# Altium footprint library FOTA.PcbLib: 41 footprints (part 2 of 3)
Each footprint in its own frame and in the unit in brackets; x right, y up, seen from the top. Pads: shape width x height; smd on the part's side, far side on the other; paste and mask are expansions set on the pad; w line width, h text height; cw(c..) or ccw(c..) is an arc to the next point about the centre after c.
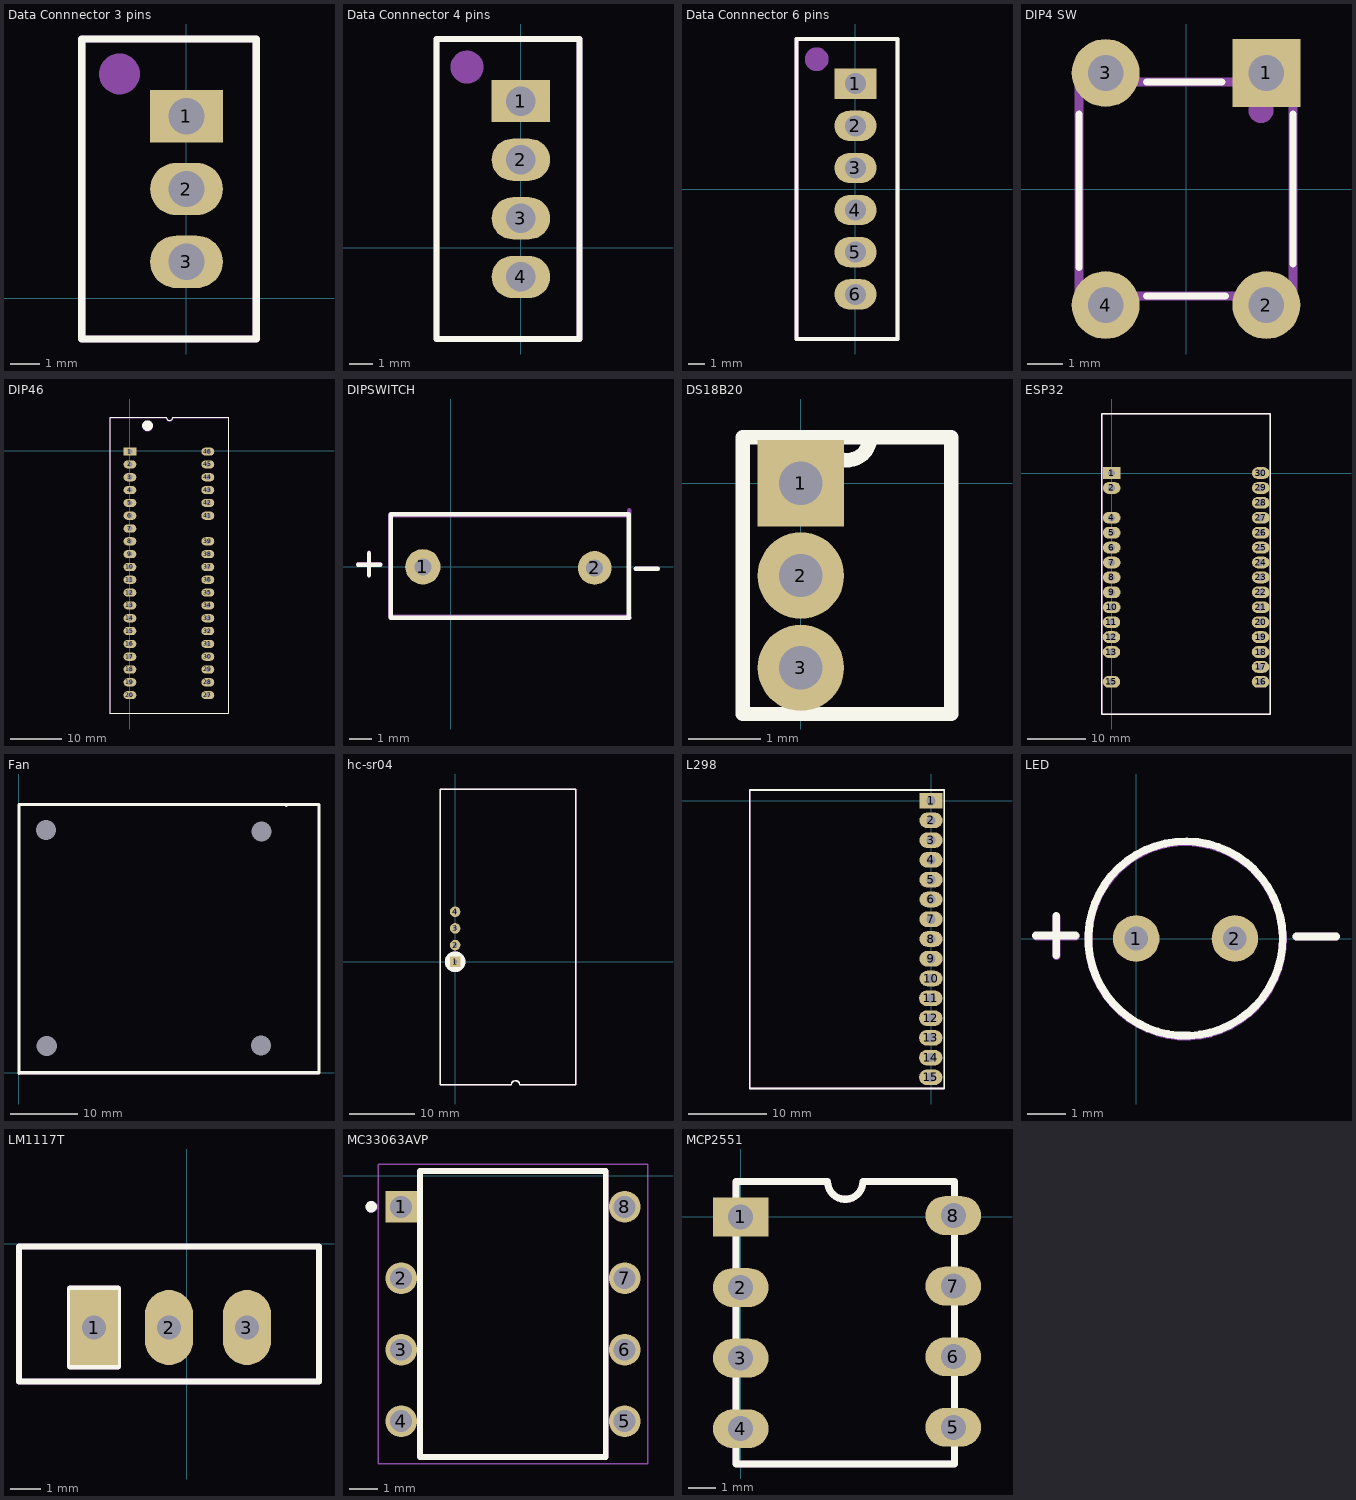
[diagram p1: the footprints below, top view; thin cyan lines are the x and y axes]

## Data Connnector 3 pins [mm]
pads (3):
  rect 2.5x1.8 hole 1.25: 1(0,6.25)
  oval 2.5x1.8 hole 1.25: 2(0,3.75) 3(0,1.25)
Top Overlay:
  lines w0.254: -3.6,-1.4 2.4,-1.4 2.4,8.9 -3.6,8.9 -3.6,-1.4
Mechanical 2:
  circle w1: c-2.3,7.7 r0.2
  lines w0.254: -3.6,-1.4 -3.6,8.9 2.4,8.9 2.4,-1.4 -3.6,-1.4
  text ".Designator" at -1.4,5.2 h2
3D body "User Library-jst-b3b-xh-a.step": height 6.91, standoff -3.49, extent -3.475,-1.2 2.275,8.7

## Data Connnector 4 pins [mm]
pads (4):
  rect 2.5x1.8 hole 1.25: 1(0,6.25)
  oval 2.5x1.8 hole 1.25: 2(0,3.75) 3(0,1.25) 4(0,-1.25)
Top Overlay:
  lines w0.254: -3.6,-3.9 -3.6,8.9 2.5,8.9 2.5,-3.9 -3.6,-3.9
Mechanical 2:
  circle w1: c-2.3,7.7 r0.2
  lines w0.254: -3.6,-3.9 2.5,-3.9 2.5,8.9 -3.6,8.9 -3.6,-3.9
  text ".Designator" at -1.4,5.2 h2
3D body "User Library-jst-b4b-xh-a-1.step": height 6.91, standoff -3.49, extent -3.45,-3.7 2.3,8.7

## Data Connnector 6 pins [mm]
pads (6):
  rect 2.5x1.8 hole 1.25: 1(0,6.25)
  oval 2.5x1.8 hole 1.25: 2(0,3.75) 3(0,1.25) 4(0,-1.25) 5(0,-3.75) 6(0,-6.25)
Top Overlay:
  lines w0.254: -3.5,-8.9 2.5,-8.9 2.5,8.9 -3.5,8.9 -3.5,-8.9
Mechanical 2:
  circle w1: c-2.3,7.7 r0.2
  lines w0.254: -3.5,-8.9 2.5,-8.9 2.5,8.9 -3.5,8.9 -3.5,-8.9
  text ".Designator" at -1,3.2 h2
3D body "User Library-jst-b6b-xh-a.step": height 6.91, standoff -3.49, extent -3.375,-8.7 2.375,8.7

## DIP4 SW [mm]
pads (4):
  rect 1.9x1.9 hole 1: 1(2.25,3.25)
  round 1.9 hole 1: 2(2.25,-3.25) 3(-2.25,3.25) 4(-2.25,-3.25)
Top Overlay:
  lines w0.2: -3,-2.2 -3,2.1 ; -1.1,-3 1.1,-3 ; -1.1,3 1,3 ; 3,-2.1 3,2.1
Mechanical 2:
  circle w0.5: c2.1,2.2 r0.1
  lines w0.254: -3,-3 -3,-1.6 -3,3 3,3 3,-3 -3,-3
  text ".Designator" at -1,-0.4 h1.52
Mechanical 3:
  lines w0.2: -3,-3 -3,2.2 -3,3 3,3 3,-3 -3,-3
3D body "User Library-FSM4JLH(1825910-5).step": height 5, standoff -3.51, extent -2.995,-3.898 2.995,3.9

## DIP46 [mm]
pads (39):
  rect 2.5x1.6 hole 1: 1(0,-0.127)
  oval 2.5x1.6 hole 1: 2(0,-2.627) 3(0,-5.127) 4(0,-7.627) 5(0,-10.127) 6(0,-12.627) 7(0,-15.127) 8(0,-17.627) 9(0,-20.127) 10(0,-22.627) 11(0,-25.127) 12(0,-27.627) 13(0,-30.127) 14(0,-32.627) 15(0,-35.127) 16(0,-37.627) 17(0,-40.127) 18(0,-42.627) 19(0,-45.127) 20(0,-47.627) 27(15.2,-47.627) 28(15.2,-45.127) 29(15.2,-42.627) 30(15.2,-40.127) 31(15.2,-37.627) 32(15.2,-35.127) 33(15.2,-32.627) 34(15.2,-30.127) 35(15.2,-27.627) 36(15.2,-25.127) 37(15.2,-22.627) 38(15.2,-20.127) 39(15.2,-17.627) 41(15.2,-12.627) 42(15.2,-10.127) 43(15.2,-7.627) 44(15.2,-5.127) 45(15.2,-2.627) 46(15.2,-0.127)
Top Overlay:
  circle w1.27: c3.429,4.953 r0.402
  lines w0.2: -3.937,6.584 7.102,6.584 ccw(c7.727,6.584) 8.352,6.584 19.177,6.584 ; -3.937,6.604 -3.937,-51.181 19.177,-51.181 19.177,6.604
Mechanical 29:
  circle w1.27: c3.429,4.826 r0.402
  lines w0.2: -3.937,-51.308 -3.937,6.477 ; -3.937,6.457 7.102,6.457 ccw(c7.727,6.457) 8.352,6.457 19.177,6.457 ; 19.177,-51.308 19.177,6.477
  text "'.Designator'" at -3.937,-49.53 h3
3D body "stm32f103c8t6-board.SLDPRT": height 11.51, standoff -5.49, extent -3.861,-51.191 19.139,6.609

## DIPSWITCH [mm]
pads (2):
  round 1.575 hole 0.762: 1(-1.25,0)
  round 1.5 hole 0.762: 2(6.4,-0.05)
Top Overlay:
  lines w0.2: -4.14,0.1 -3.15,0.1 ; -3.65,-0.38 -3.65,0.61 ; 7.925,-2.262 7.925,-0.038 7.925,2.35 -2.675,2.35 -2.675,-2.262 7.945,-2.262 ; 8.225,-0.088 9.215,-0.088
Mechanical 29:
  lines w0.2: -4.14,0.125 -3.15,0.125 ; -3.65,-0.355 -3.65,0.635 ; 7.945,-2.268 7.945,-0.098 7.945,2.518 ; 7.945,-2.225 -2.7,-2.225 -2.7,2.3 7.945,2.3 ; 8.23,-0.088 9.22,-0.088
  text "'.Designator'" at -2.1,-1.3 h1.02
3D body "User Library-DIP_1.step": height 6.51, standoff -3.96, extent -2.5,-2.05 7.5,1.95

## DS18B20 [mm]
pads (3):
  rect 1.2x1.2 hole 0.6: 1(0,0)
  round 1.2 hole 0.6: 2(0,-1.28) 3(0,-2.56)
Top Overlay:
  lines w0.2: -0.805,-3.2 -0.805,0.64 0.96,0.64 cw(c0.64,0.64) 0.32,0.64 2.085,0.64 2.085,-3.2 -0.805,-3.2

## ESP32 [mm]
pads (28):
  rect 3x2 hole 1.2: 1(0,0)
  oval 3x2 hole 1.2: 2(0,-2.54) 4(0,-7.62) 5(0,-10.16) 6(0,-12.7) 7(0,-15.24) 8(0,-17.78) 9(0,-20.32) 10(0,-22.86) 11(-0.04,-25.41) 12(-0.04,-27.95) 13(-0.04,-30.49) 15(-0.04,-35.57) 16(25.36,-35.57) 17(25.36,-33.03) 18(25.36,-30.49) 19(25.36,-27.95) 20(25.36,-25.41) 21(25.4,-22.86) 22(25.4,-20.32) 23(25.4,-17.78) 24(25.4,-15.24) 25(25.4,-12.7) 26(25.4,-10.16) 27(25.4,-7.62) 28(25.4,-5.08) 29(25.4,-2.54) 30(25.4,0)
Top Overlay:
  lines w0.254: -1.7,-41.05 -1.7,10.06 27.03,10.06 27.03,-41.05 -1.7,-41.05
Mechanical 2:
  circle w0.8: c-0.4,0.4 r0.2
  lines w0.254: -1.7,-41.05 -1.7,10.06 27.02,10.06 27.02,-41.05 -1.7,-41.05
  text ".Designator" at 11.86,-5.28 h2
3D body "female_header_a-bl254-eg-z15d.stp": height 8.51, standoff -3.19, extent 24.19,-36.77 26.69,1.58
3D body "female_header_a-bl254-eg-z15d.stp": height 8.51, standoff -3.19, extent -1.25,-36.99 1.25,1.36
3D body "ESP-32_v1.STEP": height 15.2, standoff 2.8, extent -1.58,-40.97 26.92,9.96

## Fan [mm]
pads (4):
  round 0 hole 3 unplated: 1(4.1,36.3) 1(4.2,4) 1(36.2,4.1) 1(36.3,36.1)
Top Overlay:
  lines w0.5: 0.05,-0.1 0.05,40.1 39.9,40.1 ; 0.15,0 44.9,0 44.9,40.1 39.9,40.1 ; 40,40 39.9,40.1
Mechanical 2:
  lines w0.254: 0.05,-0.1 44.9,-0.1 44.9,40.1 0.05,40.1
  text ".Designator" at 12.5,17.4 h8
3D body "User Library-fan-40x40x15.STEP": height 15, standoff -13, extent 0.125,0.1 44.875,40.1

## hc-sr04 [mm]
pads (4):
  rect 1.6x1.6 hole 0.7: 1(0,0.025)
  round 1.6 hole 0.7: 2(0,2.565) 3(0,5.105) 4(0,7.645)
Top Overlay:
  circle w2.032: c0,0.025 r0.555
  lines w0.2: -2.286,-18.745 8.58,-18.745 cw(c9.215,-18.745) 9.85,-18.745 18.415,-18.745 18.415,26.365 -2.286,26.365 -2.286,-18.745
Mechanical 29:
  circle w2.032: c0,0.025 r0.555
  lines w0.2: -2.286,-18.745 -2.286,26.365 18.415,26.365 18.415,-18.745 9.85,-18.745 ccw(c9.215,-18.745) 8.58,-18.745 -2.286,-18.745
  text "'.Designator'" at -7.976,-14.097 h3.56
3D body "Ultrasonic Sensor HC-SR04 2.STEP": height 20.61, standoff -5.14, extent -0.305,-18.739 18.245,26.461

## L298 [mm]
pads (15):
  rect 3x2 hole 1.2: 1(0,0)
  oval 3x2 hole 1.2: 2(0,-2.54) 3(0,-5.08) 4(0,-7.62) 5(0,-10.16) 6(0,-12.7) 7(0,-15.24) 8(0,-17.78) 9(0,-20.32) 10(0,-22.86) 11(-0.04,-25.4) 12(-0.04,-27.94) 13(-0.04,-30.48) 14(-0.04,-33.02) 15(-0.04,-35.56)
Top Overlay:
  lines w0.254: -23.3,-37 -23.3,1.4 1.7,1.4 1.7,-37 -23.3,-37
Mechanical 2:
  circle w0.8: c-0.4,0.4 r0.2
  lines w0.254: -23.3,-37 -23.3,1.4 1.7,1.4 1.7,-37 -23.3,-37
  text ".Designator" at -0.5,-5.7 h1.52
3D body: height 25, standoff 0.1, extent -23.225,-25.625 -13.475,-12.175
3D body "Pin Header 1x15 TH Pitch 2.54mm.stp": height 9.5, standoff -3.2, extent -1.27,-36.83 1.27,1.27
3D body: height 15.7, standoff -3.94, extent -1.27,1.27 -1.27,1.27
3D body: height 0.1, standoff 0, extent -23.15,-36.85 -1.27,1.3

## LED [mm]
pads (2):
  round 1.2 hole 0.61: 1(0,0) 2(2.54,0)
Top Overlay:
  lines w0.2: -2.576,0.075 -1.56,0.075 ; -2.055,-0.432 -2.055,0.584 ; 3.413,-1.287 cw(c1.27,0) 3.421,-1.274 ; 4.125,0.05 5.141,0.05
Mechanical 29:
  lines w0.2: -2.571,0.05 -1.555,0.05 ; -2.05,-0.457 -2.05,0.559 ; 3.418,-1.312 cw(c1.275,-0.025) 3.423,-1.304 ; 4.125,0.05 5.141,0.05
3D body "everlight-3MM-LED-GREEN.step": height 5.21, standoff -7.35, extent -0.651,-1.9 2.775,1.9

## LM1117T [mm]
pads (3):
  rect 1.6x2.5 hole 0.8: 1(-3.1,-2.8)
  oval 1.6x2.5 hole 0.8: 2(-0.6,-2.8) 3(2,-2.8)
Top Overlay:
  lines w0.2: -5.6,-4.6 -5.6,-0.1 4.4,-0.1 4.4,-4.6 -5.6,-4.6 ; -3.9,-4.1 -2.3,-4.1 -2.3,-1.5 -3.9,-1.5 -3.9,-4.1
Mechanical 29:
  lines w0.2: -5.6,-4.6 4.4,-4.6 4.4,-0.1 -5.6,-0.1 -5.6,-4.6 ; -3.9,-4.1 -3.9,-1.5 -2.3,-1.5 -2.3,-4.1 -3.9,-4.1
  text "'.Designator'" at -5.8,-1.1 h1.02
3D body "lm7805act.stp": height 18.51, standoff -9.96, extent -5.63,-4.5 4.43,-0.06

## MC33063AVP [mm]
pads (8):
  rect 1.13x1.13 hole 0.78: 1(4.547,-1.104)
  round 1.13 hole 0.78: 2(4.547,-3.644) 3(4.547,-6.184) 4(4.547,-8.724) 5(12.487,-8.724) 6(12.487,-6.184) 7(12.487,-3.644) 8(12.487,-1.104)
Top Overlay:
  circle w0.2: c3.482,-1.104 r0.1
  lines w0.127: 5.217,-9.994 11.817,-9.994 ; 5.217,0.166 11.817,0.166
  lines w0.2: 5.217,-9.994 5.217,0.166 11.817,0.166 11.817,-9.994 5.217,-9.994
Mechanical 13:
  circle w0.2: c3.482,-1.104 r0.1
  lines w0.127: 5.217,-9.994 5.217,0.166 11.817,0.166 11.817,-9.994 5.217,-9.994
Mechanical 15:
  lines w0.05: 3.732,-10.244 3.732,0.416 13.302,0.416 13.302,-10.244 3.732,-10.244
Mechanical 29:
  circle w0.2: c3.507,-1.104 r0.1
  lines w0.127: 5.242,-9.994 11.842,-9.994 11.842,0.166 5.242,0.166 5.242,-9.994
  text "'.Designator'" at 3.9,-9.075 h1.02
3D body "step_temp.STEP": height 5.08, standoff -3.9, extent 4.557,-9.742 12.477,-0.086

## MCP2551 [mm]
pads (8):
  rect 2x1.397 hole 0.9: 1(0,0)
  oval 2x1.397 hole 0.9: 2(0,-2.54) 3(0,-5.08) 4(0,-7.62) 5(7.647,-7.569) 6(7.647,-5.029) 7(7.647,-2.489) 8(7.647,0.051)
Top Overlay:
  lines w0.254: -0.176,-8.89 -0.176,1.27 3.126,1.27 ccw(c3.761,1.27) 4.396,1.27 7.698,1.27 7.698,-8.89 -0.176,-8.89
Mechanical 29:
  lines w0.254: -0.176,-8.89 7.698,-8.89 7.698,1.27 4.396,1.27 cw(c3.761,1.27) 3.126,1.27 -0.176,1.27 -0.176,-8.89
  text "'.Designator'" at -1.1,-8.4 h1.27
3D body "P.STEP": height 5.35, standoff -3.8, extent -0.137,-8.436 7.737,0.835

## PCBComponent_1 [mm]